# Altium schematic symbol library altera-stratix-iv.SCHLIB: 38 symbols (part 8 of 21) (continued)
## EP4SGX110DF29 (continued)

## EP4SGX110FF35
designator IC?, comment EP4SGX110FF35   Auto generated by make-symbol-device-package-bsdl.ulp Rev. 29 Source: EP4SGX110FF35.bsd
MPN: EP4SGX110FF35C3N
footprint FBGA1152
pins: A2 IOA2, A3 IOA3, A4 IOA4, A5 IOA5, A6 IOA6, A7 IOA7, A8 IOA8, A9 NC241, A10 NC242, A11 NC243, A12 IOA12, A13 IOA13, A14 IOA14, A15 IOA15, A16 IOA16, A17 IOA17, A18 IOA18, A19 IOA19, A20 IOA20, A21 IOA21, A22 IOA22, A23 IOA23, A24 NC244, A25 NC245, A26 NC246, A27 IOA27, A28 IOA28, A29 IOA29, A30 IOA30, A31 IOA31, A32 IOA32, A33 IOA33, AA1 GXB_RX_R5N, AA2 GXB_RX_R5P, AA3 GND@258 (power), AA4 GND@259 (power), AA5 VCC@140 (power), AA6 GND@260 (power), AA7 VCC@128 (power), AA8 GND@221 (power), AA9 VCC@134 (power), AA10 IOAA10, AA11 IOAA11, AA12 IOAA12, AA13 VCC@54 (power), AA14 GND@41 (power), AA15 VCC@55 (power), AA16 GND@42 (power), AA17 VCC@56 (power), AA18 GND@43 (power), AA19 VCC@57 (power), AA20 GND@44 (power), AA21 VCC@58 (power), AA22 GND@45 (power), AA23 IOAA23, AA24 GND@46 (power), AA25 IOAA25, AA26 VCC@131 (power), AA27 GND@196 (power), AA28 VCC@126 (power), AA29 GND@197 (power), AA30 VCC@139 (power), AA31 GND@198 (power), AA32 GND@199 (power), AA33 GXB_RX_L5P, AA34 GXB_RX_L5N, AB1 GND@254 (power), AB2 GND@255 (power), AB3 GXB_TX_R5N, AB4 GXB_TX_R5P, AB5 GND@256 (power), AB6 VCC@145 (power), AB7 GND@257 (power), AB8 VCC@156 (power), AB9 VCC@157 (power), AB10 IOAB10, AB11 IOAB11, AB12 IOAB12, AB13 GND@36 (power), AB14 VCC@49 (power), AB15 GND@37 (power), AB16 VCC@50 (power), AB17 GND@38 (power), AB18 VCC@51 (power), AB19 GND@39 (power), AB20 VCC@52 (power), AB21 GND@40 (power), AB22 VCC@53 (power), AB23 IOAB23, AB24 IOAB24, AB25 IOAB25, AB26 VCC@152 (power), AB27 VCC@153 (power), AB28 GND@192 (power), AB29 VCC@143 (power), AB30 GND@193 (power), AB31 GXB_TX_L5P, AB32 GXB_TX_L5N, AB33 GND@194 (power), AB34 GND@195 (power), AC1 GXB_RX_R4N, AC2 GXB_RX_R4P, AC3 GND@252 (power), AC4 GND@253 (power), AC5 GXB_CMURX_R3N, AC6 GXB_CMURX_R3P, AC7 NC92, AC8 GND@1 (power), AC9 GND@34 (power), AC10 IOAC10, AC11 GND@35 (power), AC12 IOAC12, AC13 VCC@102 (power), AC14 NC93, AC15 NC94, AC16 NC95, AC17 VCC@101 (power), AC18 IOAC18, AC19 VCC@100 (power), AC20 NC96, AC21 NC97, AC22 IOAC22, AC23 VCC@99 (power), AC24 IOAC24, AC25 IOAC25, AC26 IOAC26, AC27 NCONFIG, AC28 NC98, AC29 GXB_CMURX_L3P, AC30 GXB_CMURX_L3N, AC31 GND@190 (power), AC32 GND@191 (power), AC33 GXB_RX_L4P, AC34 GXB_RX_L4N, AD1 GND@248 (power), AD2 GND@249 (power), AD3 GXB_TX_R4N, AD4 GXB_TX_R4P, AD5 GND@250 (power), AD6 GND@251 (power), AD7 NC86, AD8 NCSO, AD9 IOAD9, AD10 VCC@120 (power), AD11 IOAD11, AD12 GND@28 (power), AD13 IOAD13, AD14 NC87, AD15 GND@29 (power), AD16 NC88, AD17 NC89, AD18 GND@30 (power), AD19 IOAD19, AD20 NC90, AD21 GND@31 (power), AD22 IOAD22, AD23 IOAD23, AD24 GND@32 (power), AD25 VCC@119 (power), AD26 IOAD26, AD27 GND@33 (power), AD28 NC91, AD29 GND@186 (power), AD30 GND@187 (power), AD31 GXB_TX_L4P, AD32 GXB_TX_L4N, AD33 GND@188 (power), AD34 GND@189 (power), AE1 GXB_RX_R3N, AE2 GXB_RX_R3P, AE3 GND@246 (power), AE4 GND@247 (power), AE5 GXB_CMURX_R2N, AE6 GXB_CMURX_R2P, AE7 NC77, AE8 NCEO, AE9 IOAE9, AE10 IOAE10, AE11 IOAE11, AE12 IOAE12, AE13 NC78, AE14 NC79, AE15 NC80, AE16 NC81, AE17 VCC@6 (power), AE18 IOAE18, AE19 IOAE19, AE20 NC82, AE21 NC83, AE22 NC84, AE23 VCC@21 (power), AE24 IOAE24, AE25 IOAE25, AE26 IOAE26, AE27 IOAE27, AE28 NC85, AE29 GXB_CMURX_L2P, AE30 GXB_CMURX_L2N, AE31 GND@184 (power), AE32 GND@185 (power), AE33 GXB_RX_L3P, AE34 GXB_RX_L3N, AF1 GND@242 (power), AF2 GND@243 (power), AF3 GXB_TX_R3N, AF4 GXB_TX_R3P, AF5 GND@244 (power), AF6 GND@245 (power), AF7 NC70, AF8 GND@27 (power), AF9 VCC@29 (power), AF11 VCC@26 (power), AF12 IOAF12, AF13 NC71, AF14 NC72, AF16 NC73, AF17 VCC@113 (power), AF18 VCC@3 (power), AF19 IOAF19, AF21 NC74, AF22 NC75, AF23 IOAF23, AF24 IOAF24, AF25 VCC@20 (power), AF27 VCC@112 (power), AF28 NC76, AF29 GND@180 (power), AF30 GND@181 (power), AF31 GXB_TX_L3P, AF32 GXB_TX_L3N, AF33 GND@182 (power), AF34 GND@183 (power), AG1 GXB_RX_R2N, AG2 GXB_RX_R2P, AG3 GND@240 (power), AG4 GND@241 (power), AG5 GXB_CMURX_R1N, AG6 GXB_CMURX_R1P, AG7 NC63, AG8 VCC@114 (power), AG9 GND@20 (power), AG10 IOAG10, AG11 IOAG11, AG12 GND@21 (power), AG13 NC64, AG14 NC65, AG15 GND@22 (power), AG16 IOAG16, AG17 NC66, AG18 GND@23 (power), AG19 NC67, AG20 IOAG20, AG21 GND@24 (power), AG22 NC68, AG23 IOAG23, AG24 GND@25 (power), AG25 IOAG25, AG26 IOAG26, AG27 GND@26 (power), AG28 NC69, AG29 GXB_CMURX_L1P, AG30 GXB_CMURX_L1N, AG31 GND@178 (power), AG32 GND@179 (power), AG33 GXB_RX_L2P, AG34 GXB_RX_L2N, AH1 GND@236 (power), AH2 GND@237 (power), AH3 GXB_TX_R2N, AH4 GXB_TX_R2P, AH5 GND@238 (power), AH6 GND@239 (power), AH7 NC53, AH8 IOAH8, AH9 IOAH9, AH10 VCC@28 (power), AH11 IOAH11, AH12 NC54, AH13 NC55, AH14 NC56, AH15 IOAH15, AH16 IOAH16, AH17 NC57, AH18 VCC@5 (power), AH19 NC58, AH20 VCC@23 (power), AH21 NC59, AH22 NC60, AH23 NC61, AH24 IOAH24, AH25 IOAH25, AH26 IOAH26, AH27 IOAH27, AH28 NC62, AH29 GND@174 (power), AH30 GND@175 (power), AH31 GXB_TX_L2P, AH32 GXB_TX_L2N, AH33 GND@176 (power), AH34 GND@177 (power), AJ1 GXB_RX_R1N, AJ2 GXB_RX_R1P, AJ3 GND@234 (power), AJ4 GND@235 (power), AJ5 GXB_CMURX_R0N, AJ6 GXB_CMURX_R0P, AJ7 NC44, AJ8 IOAJ8, AJ9 IOAJ9, AJ10 IOAJ10, AJ11 IOAJ11, AJ12 NC45, AJ13 NC46, AJ14 IOAJ14, AJ15 IOAJ15, AJ16 IOAJ16, AJ17 VCC@24 (power), AJ18 VCC@4 (power), AJ19 NC47, AJ20 NC48, AJ21 IOAJ21, AJ22 NC49, AJ23 NC50, AJ24 NC51, AJ25 IOAJ25, AJ26 VCC@19 (power), AJ27 IOAJ27, AJ28 NC52, AJ29 GXB_CMURX_L0P, AJ30 GXB_CMURX_L0N, AJ31 GND@172 (power), AJ32 GND@173 (power), AJ33 GXB_RX_L1P, AJ34 GXB_RX_L1N, AK1 GND@230 (power), AK2 GND@231 (power), AK3 GXB_TX_R1N, AK4 GXB_TX_R1P, AK5 GND@232 (power), AK6 GND@233 (power), AK7 NC3, AK8 IOAK8, AK9 GND@13 (power), AK10 IOAK10, AK11 NC38, AK12 GND@14 (power), AK13 NC39, AK14 IOAK14, AK15 GND@15 (power), AK16 IOAK16, AK17 NC40, AK18 GND@16 (power), AK19 NC41, AK20 IOAK20, AK21 GND@17 (power), AK22 NC42, AK23 NC43, AK24 GND@18 (power), AK25 IOAK25, AK26 IOAK26, AK27 GND@19 (power), AK28 NC2, AK29 GND@168 (power), AK30 GND@169 (power), AK31 GXB_TX_L1P, AK32 GXB_TX_L1N, AK33 GND@170 (power), AK34 GND@171 (power), AL1 GXB_RX_R0N, AL2 GXB_RX_R0P, AL3 GND@228 (power), AL4 GND@229 (power), AL5 NC8, AL6 NC7, AL7 IOAL7, AL8 IOAL8, AL9 IOAL9, AL10 NC28, AL11 NC29, AL12 NC30, AL13 NC31, AL14 IOAL14, AL15 IOAL15, AL16 IOAL16, AL17 NC32, AL18 IOAL18, AL19 NC33, AL20 IOAL20, AL21 IOAL21, AL22 NC34, AL23 NC35, AL24 NC36, AL25 NC37, AL26 IOAL26, AL27 IOAL27, AL28 PORSEL, AL29 NC6, AL30 NC5, AL31 GND@166 (power), AL32 GND@167 (power), AL33 GXB_RX_L0P, AL34 GXB_RX_L0N, AM1 GND@226 (power), AM2 GND@227 (power), AM3 GXB_TX_R0N, AM4 GXB_TX_R0P, AM5 DCLK, AM6 NIO_PULLUP, AM7 VCC@27 (power), AM8 IOAM8, AM9 NC20, AM10 NC21, AM11 NC22, AM12 NC23, AM13 IOAM13, AM14 IOAM14, AM15 IOAM15, AM16 IOAM16, AM17 IOAM17, AM18 IOAM18, AM19 NC24, AM20 IOAM20, AM21 IOAM21, AM22 IOAM22, AM23 NC25, AM24 NC26, AM25 NC27, AM26 IOAM26, AM27 IOAM27, AM28 VCC@18 (power), AM29 NCE, AM30 NSTATUS, AM31 GXB_TX_L0P, AM32 GXB_TX_L0N, AM33 GND@164 (power), AM34 GND@165 (power), AN1 RREF_R0, AN2 GND@223 (power), AN3 GND@224 (power), AN4 GND@225 (power), AN5 ASDO, AN6 GND@4 (power), AN7 IOAN7, AN8 IOAN8, AN9 GND@5 (power), AN10 NC15, AN11 NC16, AN12 GND@6 (power), AN13 IOAN13, AN14 IOAN14, AN15 GND@7 (power), AN16 VCC@25 (power), AN17 IOAN17, AN18 GND@8 (power), AN19 VCC@22 (power), AN20 NC17, AN21 GND@9 (power), AN22 IOAN22, AN23 IOAN23, AN24 GND@10 (power), AN25 NC18, AN26 NC19, AN27 GND@11 (power), AN28 IOAN28, AN29 GND@12 (power), AN30 CONF_DONE, AN31 GND@161 (power), AN32 GND@162 (power), AN33 GND@163 (power), AN34 RREF_L0, AP2 GND@222 (power), AP3 IOAP3, AP4 IOAP4, AP5 IOAP5, AP6 IOAP6, AP7 IOAP7, AP8 IOAP8, AP9 NC9, AP10 NC10, AP11 NC11, AP12 IOAP12, AP13 IOAP13, AP14 IOAP14, AP15 IOAP15, AP16 IOAP16, AP17 IOAP17, AP18 IOAP18, AP19 IOAP19, AP20 IOAP20, AP21 IOAP21, AP22 IOAP22, AP23 IOAP23, AP24 NC12, AP25 NC13, AP26 NC14, AP27 IOAP27, AP28 IOAP28, AP29 IOAP29, AP30 IOAP30, AP31 IOAP31, AP32 IOAP32, AP33 GND@160 (power), B1 IOB1, B2 GND@133 (power), B3 IOB3, B4 IOB4, B5 GND@134 (power), B6 IOB6, B7 IOB7, B8 GND@135 (power), B9 NC237, B10 NC238, B11 GND@3 (power), B12 IOB12, B13 IOB13, B14 GND@136 (power), B15 IOB15, B16 IOB16, B17 GND@137 (power), B18 IOB18, B19 VCC@42 (power), B20 GND@138 (power), B21 IOB21, B22 IOB22, B23 GND@139 (power), B24 NC239, B25 NC240, B26 GND@140 (power), B27 IOB27, B28 IOB28, B29 GND@141 (power), B30 IOB30, B31 IOB31, B32 GND@142 (power), B33 IOB33, B34 IOB34, C1 IOC1, C2 IOC2, C3 TEMPDIODEN, C4 VCC@38 (power), C5 IOC5, C6 IOC6, C7 VCC@35 (power), C8 IOC8, C9 IOC9, C10 NC229, C11 NC230, C12 IOC12, C13 IOC13, C14 IOC14, C15 IOC15, C16 IOC16, C17 NC231, C18 IOC18, C19 NC232, C20 IOC20, C21 IOC21, C22 IOC22, C23 NC233, C24 NC234, C25 NC235, C26 NC236, C27 IOC27, C28 VCC@46 (power), C29 IOC29, C30 IOC30, C31 IOC31, C32 IOC32, C33 GND@132 (power), C34 IOC34, D1 IOD1, D2 IOD2, D3 IOD3, D4 IOD4, D5 TEMPDIODEP, D6 IOD6, D7 IOD7, D8 IOD8, D9 IOD9, D10 NC219, D11 NC220, D12 NC221, D13 NC222, D14 IOD14, D15 IOD15, D16 VCC@39 (power), D17 NC223, D18 IOD18, D19 NC224, D20 IOD20, D21 IOD21, D22 NC225, D23 NC226, D24 NC227, D25 NC228, D26 IOD26, D27 IOD27, D28 IOD28, D29 IOD29, D30 IOD30, D31 NC1, D32 IOD32, D33 IOD33, D34 IOD34, E1 IOE1, E2 GND@122 (power), E3 IOE3, E4 IOE4, E5 GND@123 (power), E6 IOE6, E7 IOE7, E8 GND@124 (power), E9 IOE9, E10 IOE10, E11 GND@125 (power), E12 NC213, E13 NC214, E14 GND@126 (power), E15 IOE15, E16 IOE16, E17 GND@127 (power), E18 IOE18, E19 NC215, E20 GND@128 (power), E21 IOE21, E22 NC216, E23 GND@129 (power), E24 NC217, E25 IOE25, E26 GND@130 (power), E27 IOE27, E28 IOE28, E29 GND@131 (power), E30 IOE30, E31 IOE31, E32 NC218, E33 IOE33, E34 IOE34, F1 NC201, F2 IOF2, F3 VCC@32 (power), F4 IOF4, F5 IOF5, F6 IOF6, F7 IOF7, F8 IOF8, F9 VCC@37 (power), F10 IOF10, F11 NC202, F12 NC203, F13 NC204, F14 NC205, F15 IOF15, F16 IOF16, F17 NC206, F18 NC207, F19 NC208, F20 NC209, F21 IOF21, F22 NC210, F23 NC211, F24 IOF24, F25 IOF25, F26 IOF26, F27 IOF27, F28 VCC@45 (power), F29 TCK, F30 GND@120 (power), F31 IOF31, F32 IOF32, F33 GND@121 (power), F34 NC212, G1 NC189, G2 NC190, G3 IOG3, G4 IOG4, G5 NC191, G6 VCC@121 (power), G7 NC4, G8 IOG8, G9 IOG9, G10 IOG10, G11 IOG11, G12 NC192, G13 NC193, G14 NC194, G15 VCC@40 (power), G16 IOG16, G17 NC195, G18 VCC@11 (power), G19 IOG19, G20 NC196, G21 VCC@41 (power), G22 NC197, G23 NC198, G24 VCC@44 (power), G25 IOG25, G26 IOG26, G27 IOG27, G28 TDI, G29 TDO (out), G30 IOG30, G31 IOG31, G32 IOG32, G33 NC199, G34 NC200, H1 NC181, H2 GND@111 (power), H3 IOH3, H4 IOH4, H5 GND@112 (power), H6 IOH6, H7 IOH7, H8 GND@113 (power), H9 IOH9, H10 IOH10, H11 GND@114 (power), H12 IOH12, H13 NC182, H14 GND@115 (power), H15 IOH15, H16 NC183, H17 GND@116 (power), H18 VCC@10 (power), H19 IOH19, H20 GND@117 (power), H21 NC184, H22 NC185, H23 GND@118 (power), H24 IOH24, H25 IOH25, H26 GND@119 (power), H27 VCC@109 (power), H28 TMS, H29 IOH29, H30 IOH30, H31 IOH31, H32 NC186, H33 NC187, H34 NC188, J1 NC167, J2 NC168, J3 NC169, J4 NC170, J5 IOJ5, J6 IOJ6, J7 NC171, J8 VCC@117 (power), J9 MSEL0, J11 IOJ11, J12 IOJ12, J13 NC172, J14 NC173, J16 NC174, J17 VCC@9 (power), J18 VCC@118 (power), J19 NC175, J21 NC176, J22 NC177, J23 IOJ23, J24 IOJ24, J25 IOJ25, J27 GND@108 (power), J28 IOJ28, J29 IOJ29, J30 GND@109 (power), J31 NC178, J32 NC179, J33 GND@110 (power), J34 NC180, K1 NC152, K2 NC153, K3 NC154, K4 VCC@34 (power), K5 IOK5, K6 IOK6, K7 IOK7, K8 IOK8, K9 MSEL2, K10 VCC@36 (power), K11 IOK11, K12 IOK12, K13 NC155, K14 NC156, K15 NC157, K16 NC158, K17 NC159, K18 VCC@12 (power), K19 NC160, K20 IOK20, K21 NC161, K22 NC162, K23 IOK23, K24 IOK24, K25 IOK25, K26 TRST, K27 VCC@15 (power), K28 IOK28, K29 IOK29, K30 IOK30, K31 NC163, K32 NC164, K33 NC165, K34 NC166, L1 NC140, L2 GND@100 (power), L3 NC141, L4 NC142, L5 GND@101 (power), L6 NC143, L7 NC144, L8 GND@102 (power), L9 VCC@33 (power), L10 MSEL1, L11 GND@103 (power), L12 IOL12, L13 IOL13, L14 GND@104 (power), L15 NC145, L16 NC146, L17 GND@105 (power), L18 IOL18, L19 IOL19, L20 GND@106 (power), L21 NC147, L22 IOL22, L23 GND@107 (power), L24 IOL24, L25 VCC@43 (power), L26 IOL26, L27 IOL27, L28 IOL28, L29 IOL29, L30 NC148, L31 NC149, L32 VCC@17 (power), L33 NC150, L34 NC151, M1 IOM1, M2 IOM2, M3 NC127, M4 NC128, M5 NC129, M6 NC130, M7 NC131, M8 IOM8, M9 IOM9, M11 IOM11, M12 VCC@105 (power), M13 IOM13, M14 NC132, M15 NC133, M16 VCC@106 (power), M17 NC134, M18 VCC@107 (power), M19 IOM19, M20 NC135, M21 NC136, M22 VCC@108 (power), M23 IOM23, M24 GND@96 (power), M25 IOM25, M27 GND@97 (power), M28 VCC@14 (power), M29 NC137, M30 GND@98 (power), M31 NC138, M32 NC139, M33 GND@99 (power), M34 IOM34, N1 ION1, N2 ION2, N3 ION3, N4 ION4, N5 NC118, N6 NC119, N7 VCC@31 (power), N8 NC120, N9 NC121, N10 ION10, N11 ION11, N12 ION12, N13 VCC@93 (power), N14 GND@91 (power), N15 VCC@94 (power), N16 GND@92 (power), N17 VCC@48 (power), N18 GND@93 (power), N19 VCC@95 (power), N20 GND@94 (power), N21 VCC@96 (power), N22 GND@95 (power), N23 VCC@97 (power), N24 ION24, N25 ION25, N26 NC122, N27 NC123, N28 NC124, N29 NC125, N30 NC126, N31 ION31, N32 ION32, N33 ION33, N34 ION34, P1 CLK10P, P2 GND@82 (power), P3 IOP3, P4 IOP4, P5 GND@83 (power), P6 NC108, P7 NC109, P8 GND@84 (power), P9 NC110, P10 NC111, P11 GND@85 (power), P12 VCC@104 (power), P13 GND@86 (power), P14 VCC@88 (power), P15 GND@87 (power), P16 VCC@89 (power), P17 GND@88 (power), P18 VCC@90 (power), P19 GND@89 (power), P20 VCC@91 (power), P21 GND@90 (power), P22 VCC@92 (power), P23 NC112, P24 NC113, P25 VCC@13 (power), P26 NC114, P27 NC115, P28 NC116, P29 IOP29, P30 NC117, P31 IOP31, P32 IOP32, P33 IOP33, P34 CLK1N, R1 CLK10N, R2 IOR2, R3 IOR3, R4 VCC@30 (power), R5 IOR5, R6 IOR6, R7 NC101, R8 NC102, R9 NC103, R11 NC104, R12 NC105, R13 VCC@83 (power), R14 GND@73 (power), R15 VCC@84 (power), R16 GND@74 (power), R17 VCC@85 (power), R18 GND@75 (power), R19 VCC@86 (power), R20 GND@76 (power), R21 VCC@87 (power), R22 GND@77 (power), R23 VCC@98 (power), R24 GND@78 (power), R25 NC106, R27 GND@79 (power), R28 NC107, R29 IOR29, R30 GND@80 (power), R31 IOR31, R32 IOR32, R33 GND@81 (power), R34 CLK1P, T1 GND@204 (power), T2 GND@203 (power), T3 GND@202 (power), T4 IOT4, T5 IOT5, T6 IOT6, T7 IOT7, T8 IOT8, T9 IOT9, T10 IOT10, T11 IOT11, T12 VCC@103 (power), T13 GND@68 (power), T14 VCC@78 (power), T15 GND@69 (power), T16 VCC@79 (power), T17 GND@70 (power), T18 VCC@80 (power), T19 GND@71 (power), T20 VCC@81 (power), T21 GND@72 (power), T22 VCC@82 (power), T23 IOT23, T24 NC99, T25 NC100, T26 IOT26, T27 IOT27, T28 IOT28, T29 IOT29, T30 IOT30, T31 IOT31, T32 GND@145 (power), T33 GND@144 (power), T34 GND@143 (power), U1 GXB_RX_R7N, U2 GXB_RX_R7P, U3 GND@208 (power), U4 GND@207 (power), U5 VCC@141 (power), U6 GND@206 (power), U7 VCC@129 (power), U8 GND@205 (power), U9 VCC@159 (power), U10 IOU10, U11 GND@63 (power), U12 IOU12, U13 VCC@74 (power), U14 GND@64 (power), U15 VCC@75 (power), U16 GND@65 (power), U17 VCC@47 (power), U18 GND@2 (power), U19 VCC@76 (power), U20 GND@66 (power), U21 VCC@77 (power), U22 GND@67 (power), U23 IOU23, U24 IOU24, U25 VCC@16 (power), U26 VCC@155 (power), U27 GND@149 (power), U28 VCC@127 (power), U29 GND@148 (power), U30 VCC@138 (power), U31 GND@147 (power), U32 GND@146 (power), U33 GXB_RX_L7P, U34 GXB_RX_L7N, V1 GND@212 (power), V2 GND@211 (power), V3 GXB_TX_R7N, V4 GXB_TX_R7P, V5 GND@210 (power), V6 VCC@124 (power), V7 GND@209 (power), V8 VCC@137 (power), V9 VCC@158 (power), V10 VCC@7 (power), V11 IOV11, V12 IOV12, V13 GND@58 (power), V14 VCC@69 (power), V15 GND@59 (power), V16 VCC@70 (power), V17 DNU, V18 VCC@71 (power), V19 GND@60 (power), V20 VCC@72 (power), V21 GND@61 (power), V22 VCC@73 (power), V23 IOV23, V24 GND@62 (power), V25 IOV25, V26 VCC@154 (power), V27 VCC@132 (power), V28 GND@153 (power), V29 VCC@122 (power), V30 GND@152 (power), V31 GXB_TX_L7P, V32 GXB_TX_L7N, V33 GND@151 (power), V34 GND@150 (power), W1 GXB_RX_R6N, W2 GXB_RX_R6P, W3 GND@216 (power), W4 GND@215 (power), W5 VCC@144 (power), W6 GND@214 (power), W7 VCC@136 (power), W8 GND@213 (power), W9 VCC@149 (power), W10 VCC@8 (power), W11 VCC@115 (power), W12 VCC@116 (power), W13 VCC@64 (power), W14 GND@53 (power), W15 VCC@65 (power), W16 GND@54 (power), W17 VCC@66 (power), W18 GND@55 (power), W19 VCC@67 (power), W20 GND@56 (power), W21 VCC@68 (power), W22 GND@57 (power), W23 IOW23, W24 VCC@2 (power), W25 VCC@1 (power), W26 VCC@146 (power), W27 GND@157 (power), W28 VCC@133 (power), W29 GND@156 (power), W30 VCC@142 (power), W31 GND@155 (power), W32 GND@154 (power), W33 GXB_RX_L6P, W34 GXB_RX_L6N, Y1 GND@220 (power), Y2 GND@219 (power), Y3 GXB_TX_R6N, Y4 GXB_TX_R6P, Y5 GND@218 (power), Y6 VCC@125 (power), Y7 GND@217 (power), Y8 VCC@135 (power), Y9 VCC@151 (power), Y10 VCC@150 (power), Y11 GND@47 (power), Y12 IOY12, Y13 GND@48 (power), Y14 VCC@59 (power), Y15 GND@49 (power), Y16 VCC@60 (power), Y17 GND@50 (power), Y18 VCC@61 (power), Y19 GND@51 (power), Y20 VCC@62 (power), Y21 GND@52 (power), Y22 VCC@63 (power), Y23 VCC@110 (power), Y24 VCC@111 (power), Y25 VCC@148 (power), Y26 VCC@147 (power), Y27 VCC@130 (power), Y28 GND@200 (power), Y29 VCC@123 (power), Y30 GND@201 (power), Y31 GXB_TX_L6P, Y32 GXB_TX_L6N, Y33 GND@159 (power), Y34 GND@158 (power)

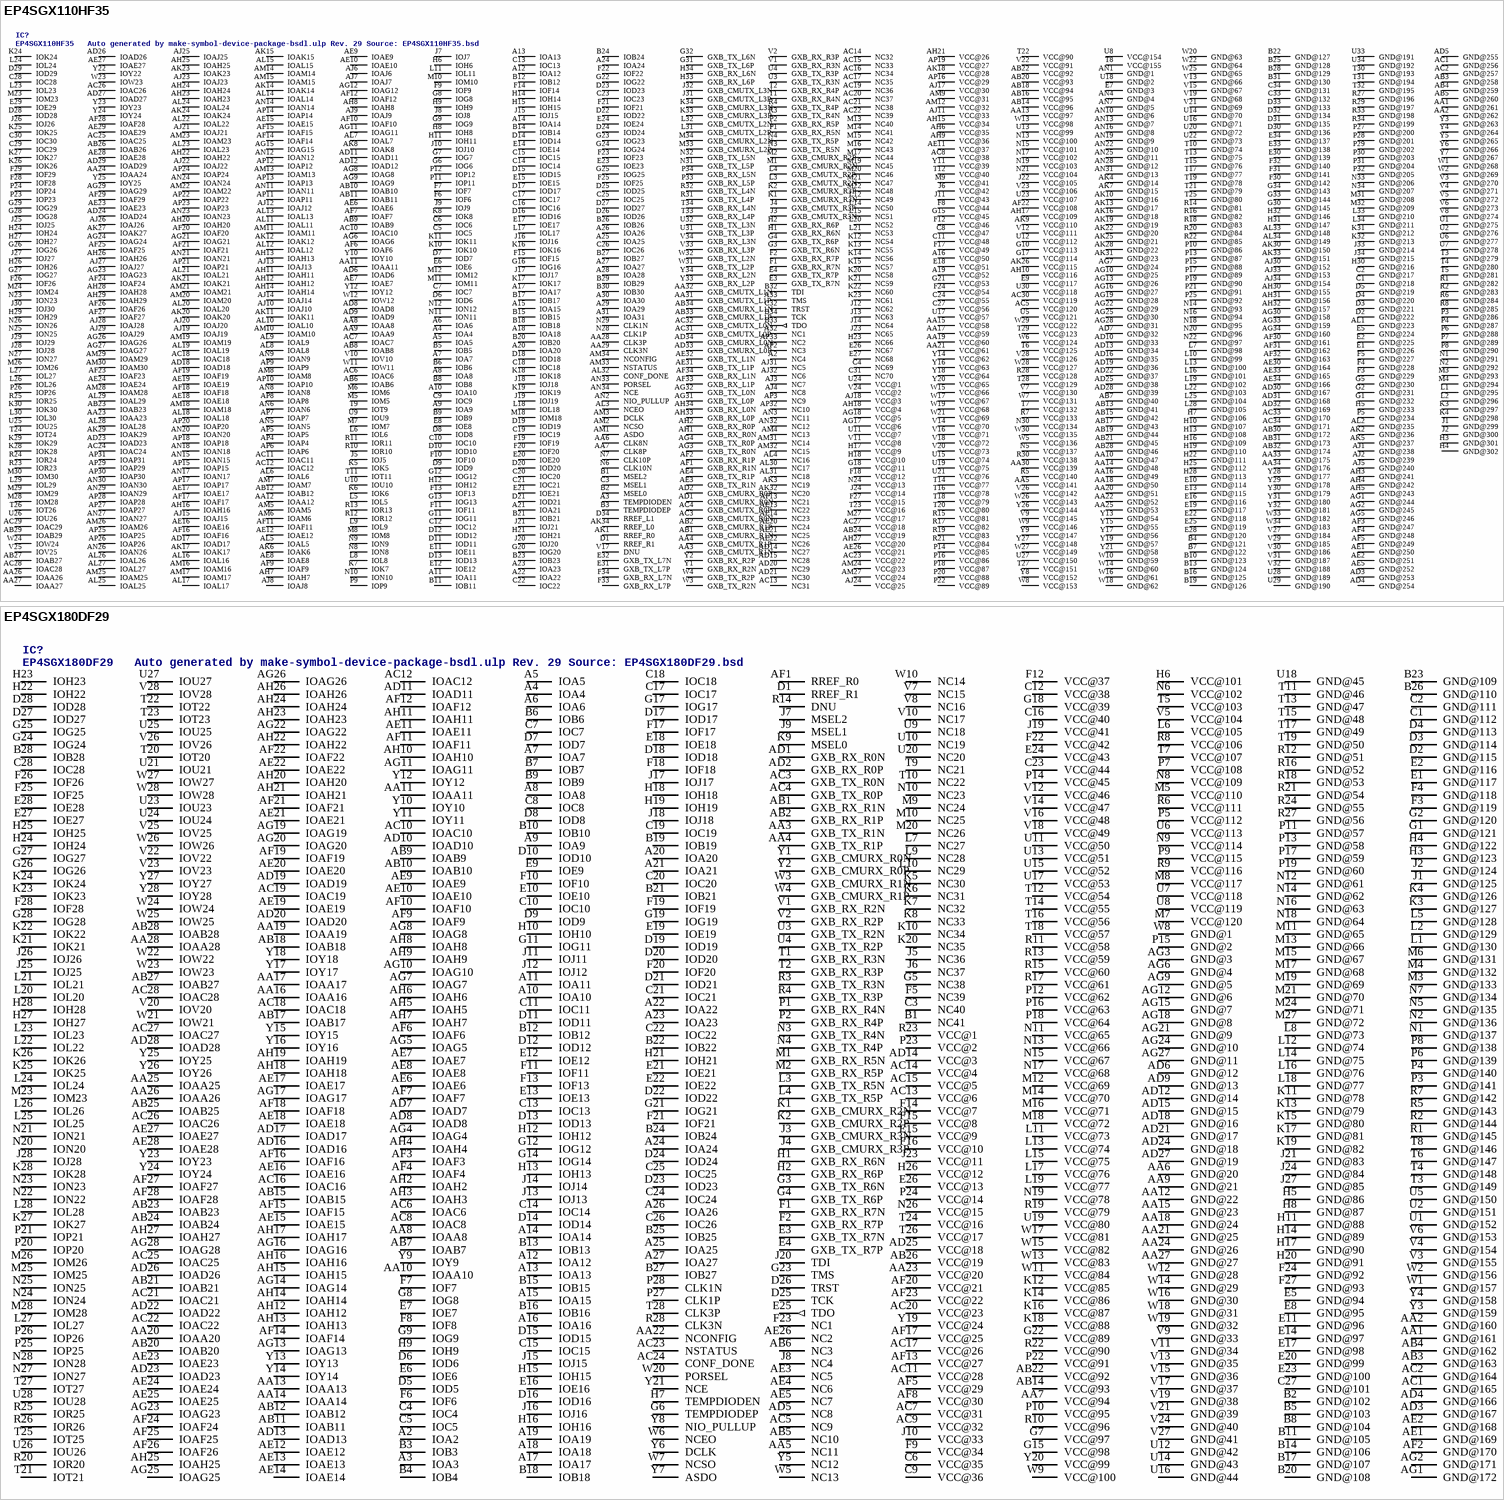
[diagram p7: symbols EP4SGX110HF35 to EP4SGX180DF29]